# Altium footprint library MYLIB.PcbLib: 600 footprints (part 13 of 39)
Each footprint in its own frame and in the unit in brackets; x right, y up, seen from the top. Pads: shape width x height; smd on the part's side, far side on the other; paste and mask are expansions set on the pad; w line width, h text height; cw(c..) or ccw(c..) is an arc to the next point about the centre after c.
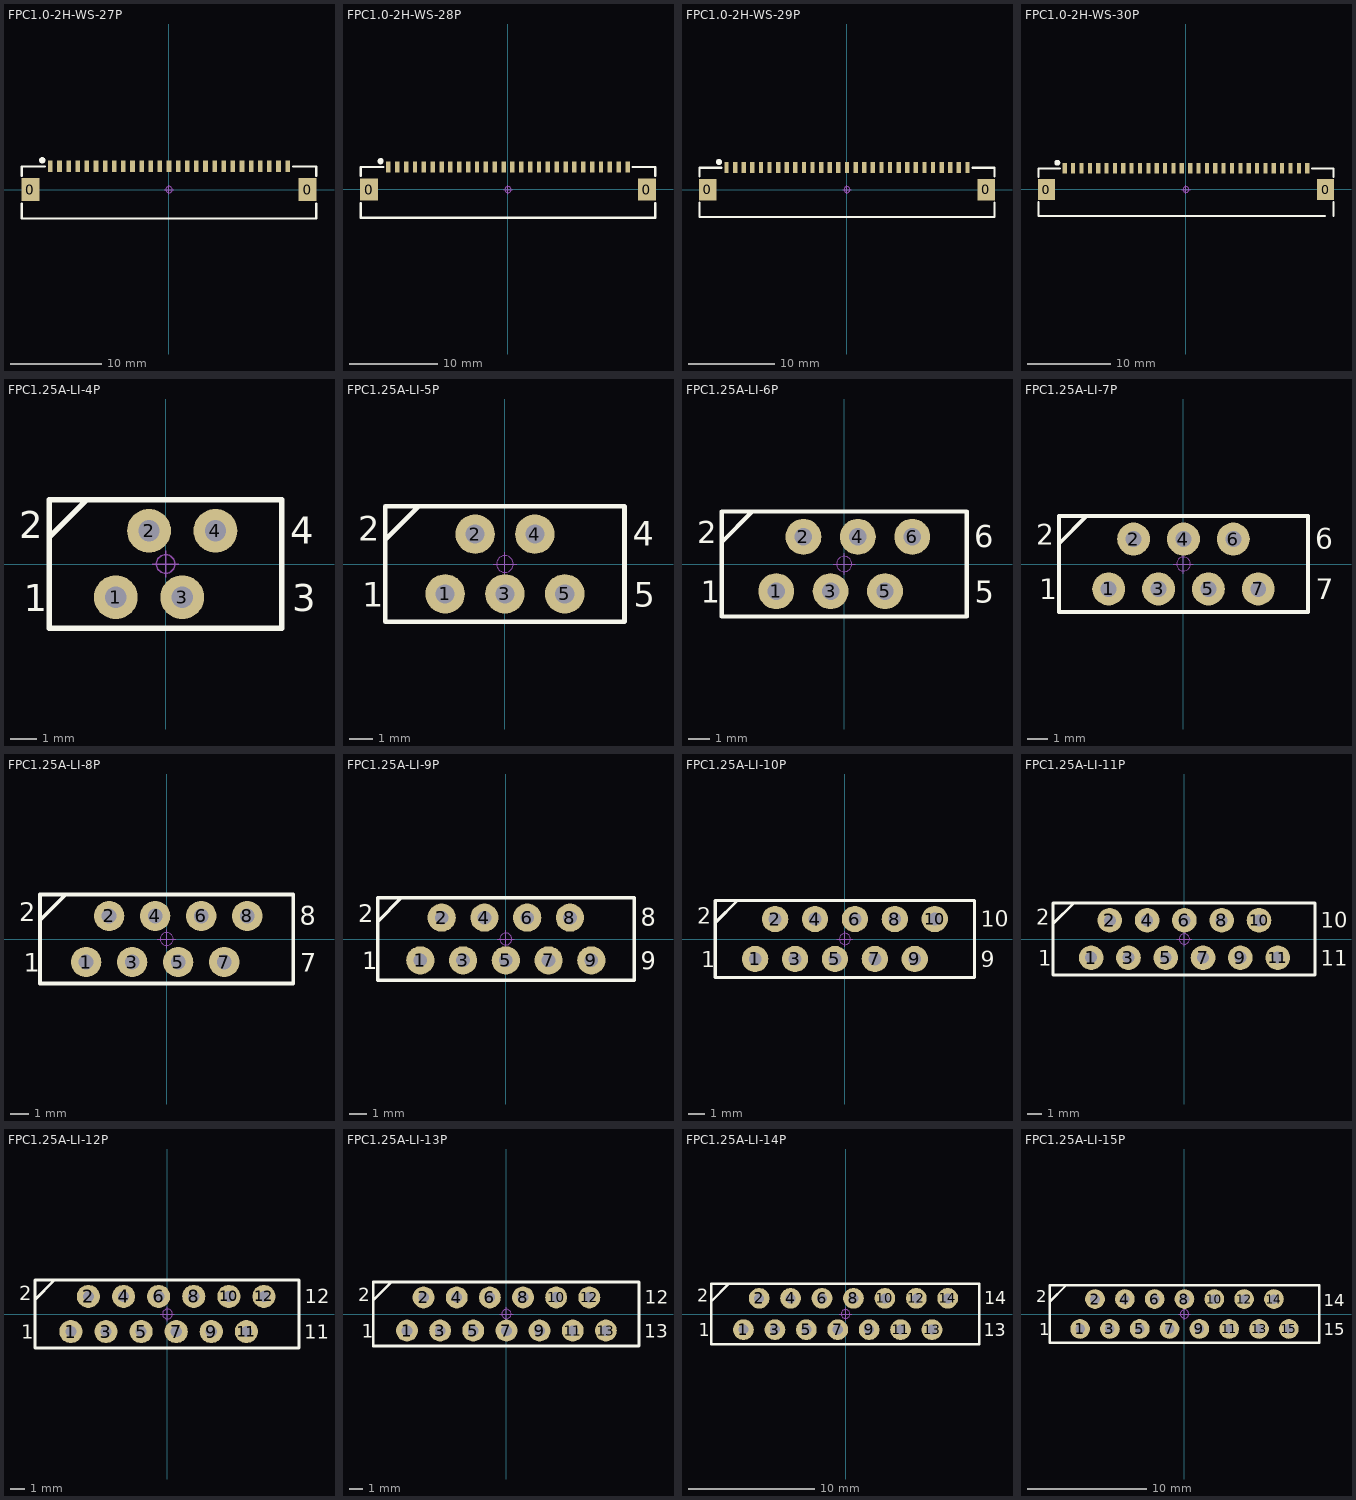
[diagram p12: the footprints below, top view; thin cyan lines are the x and y axes]

## FPC1.0-2H-WS-27P [mm] "翻盖FPC，脚距1mm，不含脚（长31.9mm，宽5.2mm，高1.96mm）"
pads (29):
  rect 2x2.5 smd: 0(-15.19,0) 0(15.19,0)
  rect 0.5x1.25 smd: 1(-13,2.575) 2(-12,2.575) 3(-11,2.575) 4(-10,2.575) 5(-9,2.575) 6(-8,2.575) 7(-7,2.575) 8(-6,2.575) 9(-5,2.575) 10(-4,2.575) 11(-3,2.575) 12(-2,2.575) 13(-1,2.575) 14(0,2.575) 15(1,2.575) 16(2,2.575) 17(3,2.575) 18(4,2.575) 19(5,2.575) 20(6,2.575) 21(7,2.575) 22(8,2.575) 23(9,2.575) 24(10,2.575) 25(11,2.575) 26(12,2.575) 27(13,2.575)
Top Overlay:
  circle w0.5: c-13.889,3.21 r0.1
  lines w0.254: -16.136,-1.524 -16.136,-3.175 16.134,-3.175 16.134,-1.524 ; -16.136,1.524 -16.136,2.54 -13.596,2.54 ; 13.594,2.54 16.134,2.54 16.134,1.524
Mechanical 15:
  circle w0.05: c0,0 r0.35
  lines w0.05: -0.5,0 0.5,0 ; 0,-0.5 0,0.5
3D body "FPC1.0 2H-WS-27P.STEP": height 2, standoff -0.02, extent -15.95,-3.15 15.95,2.85

## FPC1.0-2H-WS-28P [mm] "翻盖FPC，脚距1mm，不含脚（长32.9mm，宽5.2mm，高1.96mm）"
pads (30):
  rect 2x2.5 smd: 0(-15.69,-0.04) 0(15.69,-0.04)
  rect 0.5x1.25 smd: 1(-13.5,2.535) 2(-12.5,2.535) 3(-11.5,2.535) 4(-10.5,2.535) 5(-9.5,2.535) 6(-8.5,2.535) 7(-7.5,2.535) 8(-6.5,2.535) 9(-5.5,2.535) 10(-4.5,2.535) 11(-3.5,2.535) 12(-2.5,2.535) 13(-1.5,2.535) 14(-0.5,2.535) 15(0.5,2.535) 16(1.5,2.535) 17(2.5,2.535) 18(3.5,2.535) 19(4.5,2.535) 20(5.5,2.535) 21(6.5,2.535) 22(7.5,2.535) 23(8.5,2.535) 24(9.5,2.535) 25(10.5,2.535) 26(11.5,2.535) 27(12.5,2.535) 28(13.5,2.535)
Top Overlay:
  circle w0.5: c-14.389,3.17 r0.1
  lines w0.254: -16.636,-1.564 -16.636,-3.215 16.634,-3.215 16.634,-1.564 ; -16.636,1.484 -16.636,2.5 -14.096,2.5 ; 14.094,2.5 16.634,2.5 16.634,1.484
Mechanical 15:
  circle w0.05: c0,-0.04 r0.35
  lines w0.05: -0.5,-0.04 0.5,-0.04 ; 0,-0.54 0,0.46
3D body "FPC1.0 2H-WS-28P.STEP": height 2, standoff -0.02, extent -16.45,-3.19 16.45,2.81

## FPC1.0-2H-WS-29P [mm] "翻盖FPC，脚距1mm，不含脚（长33.9mm，宽5.2mm，高1.96mm）"
pads (31):
  rect 2x2.5 smd: 0(-16.19,0) 0(16.19,0)
  rect 0.5x1.25 smd: 1(-14,2.575) 2(-13,2.575) 3(-12,2.575) 4(-11,2.575) 5(-10,2.575) 6(-9,2.575) 7(-8,2.575) 8(-7,2.575) 9(-6,2.575) 10(-5,2.575) 11(-4,2.575) 12(-3,2.575) 13(-2,2.575) 14(-1,2.575) 15(0,2.575) 16(1,2.575) 17(2,2.575) 18(3,2.575) 19(4,2.575) 20(5,2.575) 21(6,2.575) 22(7,2.575) 23(8,2.575) 24(9,2.575) 25(10,2.575) 26(11,2.575) 27(12,2.575) 28(13,2.575) 29(14,2.575)
Top Overlay:
  circle w0.5: c-14.889,3.21 r0.1
  lines w0.254: -17.136,-1.524 -17.136,-3.175 17.134,-3.175 17.134,-1.524 ; -17.136,1.524 -17.136,2.54 -14.596,2.54 ; 14.594,2.54 17.134,2.54 17.134,1.524
Mechanical 15:
  circle w0.05: c0,0 r0.35
  lines w0.05: -0.5,0 0.5,0 ; 0,-0.5 0,0.5
3D body "FPC1.0 2H-WS-29P.STEP": height 2, standoff -0.02, extent -16.95,-3.15 16.95,2.85

## FPC1.0-2H-WS-30P [mm] "翻盖FPC，脚距1mm，不含脚（长34.9mm，宽5.2mm，高1.96mm）"
pads (32):
  rect 2x2.5 smd: 0(-16.69,-0.04) 0(16.69,-0.04)
  rect 0.5x1.25 smd: 1(-14.5,2.535) 2(-13.5,2.535) 3(-12.5,2.535) 4(-11.5,2.535) 5(-10.5,2.535) 6(-9.5,2.535) 7(-8.5,2.535) 8(-7.5,2.535) 9(-6.5,2.535) 10(-5.5,2.535) 11(-4.5,2.535) 12(-3.5,2.535) 13(-2.5,2.535) 14(-1.5,2.535) 15(-0.5,2.535) 16(0.5,2.535) 17(1.5,2.535) 18(2.5,2.535) 19(3.5,2.535) 20(4.5,2.535) 21(5.5,2.535) 22(6.5,2.535) 23(7.5,2.535) 24(8.5,2.535) 25(9.5,2.535) 26(10.5,2.535) 27(11.5,2.535) 28(12.5,2.535) 29(13.5,2.535) 30(14.5,2.535)
Top Overlay:
  circle w0.5: c-15.389,3.17 r0.1
  lines w0.254: -17.636,-1.564 -17.636,-3.215 16.634,-3.215 ; -17.636,1.484 -17.636,2.5 -15.096,2.5 ; 15.094,2.5 17.634,2.5 17.634,1.484 ; 17.634,-3.215 17.634,-1.564
Mechanical 15:
  circle w0.05: c0,-0.04 r0.35
  lines w0.05: -0.5,-0.04 0.5,-0.04 ; 0,-0.54 0,0.46
3D body "FPC1.0 2H-WS-30P.STEP": height 2, standoff -0.02, extent -17.45,-3.19 17.45,2.81

## FPC1.25A-LI-4P [mm] "4脚，长：8.5mm，宽：4.5mm，高：7.3mm"
pads (4):
  round 1.65 hole 0.8: 1(-1.875,-1.25) 2(-0.625,1.25) 3(0.625,-1.25) 4(1.875,1.25)
Top Overlay:
  lines w0.2: -4.375,1.016 -2.978,2.413 ; -4.375,-2.413 4.375,-2.413 4.375,2.413 -4.375,2.413 -4.375,-2.413
  text "1" at -5.334,-1.778 h1.02
  text "2" at -5.518,0.965 h1.02
  text "4" at 4.699,0.762 h1.02
  text "3" at 4.756,-1.778 h1.02
Mechanical 15:
  circle w0.05: c0,0 r0.35
  lines w0.05: -0.5,0 0.5,0 ; 0,-0.5 0,0.5
3D body "FPC1.25-DIP-4P.STEP": height 7.3, standoff -2.55, extent -4.3,-2.25 4.3,2.25

## FPC1.25A-LI-5P [mm] "5脚，长：9.75mm，宽：4.5mm，高：7.3mm"
pads (5):
  round 1.65 hole 0.8: 1(-2.5,-1.25) 2(-1.25,1.25) 3(0,-1.25) 4(1.25,1.25) 5(2.5,-1.25)
Top Overlay:
  lines w0.2: -5,1.016 -3.603,2.413 ; -5,-2.413 -5,2.413 5,2.413 5,-2.413 -5,-2.413
  text "5" at 5.381,-1.778 h1.02
  text "4" at 5.334,0.762 h1.02
  text "2" at -6.143,0.965 h1.02
  text "1" at -5.969,-1.778 h1.02
Mechanical 15:
  circle w0.05: c0,0 r0.35
  lines w0.05: -0.5,0 0.5,0 ; 0,-0.5 0,0.5
3D body "FPC1.25-DIP-5P.STEP": height 7.3, standoff -2.55, extent -4.925,-2.25 4.925,2.25

## FPC1.25A-LI-6P [mm] "6脚，长：11mm，宽：4.5mm，高：7.3mm"
pads (6):
  round 1.65 hole 0.8: 1(-3.125,-1.25) 2(-1.875,1.25) 3(-0.625,-1.25) 4(0.625,1.25) 5(1.875,-1.25) 6(3.125,1.25)
Top Overlay:
  lines w0.2: -5.625,1.016 -4.228,2.413 ; 5.087,2.413 5.625,2.413 ; 5.625,2.413 -5.625,2.413 -5.625,-2.413 5.625,-2.413 5.625,2.413
  text "1" at -6.604,-1.778 h1.02
  text "2" at -6.768,0.965 h1.02
  text "6" at 5.969,0.762 h1.02
  text "5" at 6.006,-1.778 h1.02
Mechanical 15:
  circle w0.05: c0,0 r0.35
  lines w0.05: -0.5,0 0.5,0 ; 0,-0.5 0,0.5
3D body "FPC1.25-DIP-6P.STEP": height 7.3, standoff -2.55, extent -5.55,-2.25 5.55,2.25

## FPC1.25A-LI-7P [mm] "7脚，长：12.25mm，宽：4.5mm，高：7.3mm"
pads (7):
  round 1.65 hole 0.8: 1(-3.75,-1.25) 2(-2.5,1.25) 3(-1.25,-1.25) 4(0,1.25) 5(1.25,-1.25) 6(2.5,1.25) 7(3.75,-1.25)
Top Overlay:
  lines w0.2: -6.25,1.016 -4.853,2.413 ; -6.25,-2.413 -6.25,2.413 5.712,2.413 6.25,2.413 6.25,-2.413 -6.25,-2.413
  text "7" at 6.631,-1.778 h1.02
  text "6" at 6.604,0.762 h1.02
  text "2" at -7.393,0.965 h1.02
  text "1" at -7.239,-1.778 h1.02
Mechanical 15:
  circle w0.05: c0,0 r0.35
  lines w0.05: -0.5,0 0.5,0 ; 0,-0.5 0,0.5
3D body "FPC1.25-DIP-7P.STEP": height 7.3, standoff -2.55, extent -6.175,-2.25 6.175,2.25

## FPC1.25A-LI-8P [mm] "8脚，长：13.5mm，宽：4.5mm，高：7.3mm"
pads (8):
  round 1.65 hole 0.8: 1(-4.375,-1.25) 2(-3.125,1.25) 3(-1.875,-1.25) 4(-0.625,1.25) 5(0.625,-1.25) 6(1.875,1.25) 7(3.125,-1.25) 8(4.375,1.25)
Top Overlay:
  lines w0.2: -6.875,1.016 -5.478,2.413 ; -6.875,-2.413 -6.875,2.413 6.875,2.413 6.875,-2.413 -6.875,-2.413
  text "7" at 7.256,-1.778 h1.02
  text "8" at 7.239,0.762 h1.02
  text "2" at -8.018,0.965 h1.02
  text "1" at -7.747,-1.778 h1.02
Mechanical 15:
  circle w0.05: c0,0 r0.35
  lines w0.05: -0.5,0 0.5,0 ; 0,-0.5 0,0.5
3D body "FPC1.25-DIP-8P.STEP": height 7.3, standoff -2.55, extent -6.8,-2.25 6.8,2.25

## FPC1.25A-LI-9P [mm] "9脚，长：14.75mm，宽：4.5mm，高：7.3mm"
pads (9):
  round 1.65 hole 0.8: 1(-5,-1.25) 2(-3.75,1.25) 3(-2.5,-1.25) 4(-1.25,1.25) 5(0,-1.25) 6(1.25,1.25) 7(2.5,-1.25) 8(3.75,1.25) 9(5,-1.25)
Top Overlay:
  lines w0.2: -7.5,1.016 -6.103,2.413 ; -7.5,-2.413 7.5,-2.413 7.5,2.413 -7.5,2.413 -7.5,-2.413
  text "1" at -8.382,-1.778 h1.02
  text "2" at -8.643,0.965 h1.02
  text "8" at 7.874,0.762 h1.02
  text "9" at 7.881,-1.778 h1.02
Mechanical 15:
  circle w0.05: c0,0 r0.35
  lines w0.05: -0.5,0 0.5,0 ; 0,-0.5 0,0.5
3D body "FPC1.25-DIP-9P.STEP": height 7.3, standoff -2.55, extent -7.425,-2.25 7.425,2.25

## FPC1.25A-LI-10P [mm] "10脚，长：16mm，宽：4.5mm，高：7.3mm"
pads (10):
  round 1.65 hole 0.8: 1(-5.625,-1.25) 2(-4.375,1.25) 3(-3.125,-1.25) 4(-1.875,1.25) 5(-0.625,-1.25) 6(0.625,1.25) 7(1.875,-1.25) 8(3.125,1.25) 9(4.375,-1.25) 10(5.625,1.25)
Top Overlay:
  lines w0.2: -8.125,1.016 -6.728,2.413 ; -8.125,-2.413 8.125,-2.413 8.125,2.413 -8.125,2.413 -8.125,-2.413
  text "1" at -9.017,-1.778 h1.02
  text "2" at -9.268,0.965 h1.02
  text "10" at 8.509,0.762 h1.02
  text "9" at 8.506,-1.778 h1.02
Mechanical 15:
  circle w0.05: c0,0 r0.35
  lines w0.05: -0.5,0 0.5,0 ; 0,-0.5 0,0.5
3D body "FPC1.25-DIP-10P.STEP": height 7.3, standoff -2.55, extent -8.05,-2.25 8.05,2.25

## FPC1.25A-LI-11P [mm] "11脚，长：17.25mm，宽：4.5mm，高：7.3mm"
pads (11):
  round 1.65 hole 0.8: 1(-6.25,-1.25) 2(-5,1.25) 3(-3.75,-1.25) 4(-2.5,1.25) 5(-1.25,-1.25) 6(0,1.25) 7(1.25,-1.25) 8(2.5,1.25) 9(3.75,-1.25) 10(5,1.25) 11(6.25,-1.25)
Top Overlay:
  lines w0.2: -8.803,1.016 -7.406,2.413 ; -8.803,-2.413 8.75,-2.413 8.75,2.413 -8.803,2.413 -8.803,-2.413
  text "1" at -9.779,-1.778 h1.02
  text "2" at -9.946,0.965 h1.02
  text "10" at 9.144,0.762 h1.02
  text "11" at 9.131,-1.778 h1.02
Mechanical 15:
  circle w0.05: c0,0 r0.35
  lines w0.05: -0.5,0 0.5,0 ; 0,-0.5 0,0.5
3D body "FPC1.25-DIP-11P.STEP": height 7.3, standoff -2.55, extent -8.675,-2.25 8.675,2.25

## FPC1.25A-LI-12P [mm] "12脚，长：18.5mm，宽：4.5mm，高：7.3mm"
pads (12):
  round 1.65 hole 0.8: 1(-6.875,-1.25) 2(-5.625,1.25) 3(-4.375,-1.25) 4(-3.125,1.25) 5(-1.875,-1.25) 6(-0.625,1.25) 7(0.625,-1.25) 8(1.875,1.25) 9(3.125,-1.25) 10(4.375,1.25) 11(5.625,-1.25) 12(6.875,1.25)
Top Overlay:
  lines w0.2: -9.428,1.016 -8.031,2.413 ; -9.428,-2.413 -9.428,2.413 9.375,2.413 9.375,-2.413 -9.428,-2.413
  text "11" at 9.756,-1.778 h1.02
  text "12" at 9.779,0.762 h1.02
  text "2" at -10.571,0.965 h1.02
  text "1" at -10.414,-1.778 h1.02
Mechanical 15:
  circle w0.05: c0,0 r0.35
  lines w0.05: -0.5,0 0.5,0 ; 0,-0.5 0,0.5
3D body "FPC1.25-DIP-12P.STEP": height 7.3, standoff -2.55, extent -9.3,-2.25 9.3,2.25

## FPC1.25A-LI-13P [mm] "13脚，长：19.75mm，宽：4.5mm，高：7.3mm"
pads (13):
  round 1.65 hole 0.8: 1(-7.5,-1.25) 2(-6.25,1.25) 3(-5,-1.25) 4(-3.75,1.25) 5(-2.5,-1.25) 6(-1.25,1.25) 7(0,-1.25) 8(1.25,1.25) 9(2.5,-1.25) 10(3.75,1.25) 11(5,-1.25) 12(6.25,1.25) 13(7.5,-1.25)
Top Overlay:
  lines w0.2: -10.053,1.016 -8.656,2.413 ; -10.053,-2.413 10,-2.413 10,2.413 -10.053,2.413 -10.053,-2.413
  text "1" at -10.922,-1.778 h1.02
  text "2" at -11.196,0.965 h1.02
  text "12" at 10.414,0.762 h1.02
  text "13" at 10.381,-1.778 h1.02
Mechanical 15:
  circle w0.05: c0,0 r0.35
  lines w0.05: -0.5,0 0.5,0 ; 0,-0.5 0,0.5
3D body "FPC1.25-DIP-13P.STEP": height 7.3, standoff -2.55, extent -9.925,-2.25 9.925,2.25

## FPC1.25A-LI-14P [mm] "14脚，长：21mm，宽：4.5mm，高：7.3mm"
pads (14):
  round 1.65 hole 0.8: 1(-8.125,-1.25) 2(-6.875,1.25) 3(-5.625,-1.25) 4(-4.375,1.25) 5(-3.125,-1.25) 6(-1.875,1.25) 7(-0.625,-1.25) 8(0.625,1.25) 9(1.875,-1.25) 10(3.125,1.25) 11(4.375,-1.25) 12(5.625,1.25) 13(6.875,-1.25) 14(8.125,1.25)
Top Overlay:
  lines w0.2: -10.678,1.016 -9.281,2.413 ; -10.678,-2.413 10.625,-2.413 10.625,2.413 -10.678,2.413 -10.678,-2.413
  text "14" at 11.029,0.762 h1.02
  text "1" at -11.684,-1.778 h1.02
  text "2" at -11.821,0.965 h1.02
  text "13" at 11.006,-1.778 h1.02
Mechanical 15:
  circle w0.05: c0,0 r0.35
  lines w0.05: -0.5,0 0.5,0 ; 0,-0.5 0,0.5
3D body "FPC1.25-DIP-14P.STEP": height 7.3, standoff -2.55, extent -10.55,-2.25 10.55,2.25

## FPC1.25A-LI-15P [mm] "15脚，长：22.4mm，宽：4.5mm，高：7.3mm"
pads (15):
  round 1.65 hole 0.8: 1(-8.75,-1.25) 2(-7.5,1.25) 3(-6.25,-1.25) 4(-5,1.25) 5(-3.75,-1.25) 6(-2.5,1.25) 7(-1.25,-1.25) 8(0,1.25) 9(1.25,-1.25) 10(2.5,1.25) 11(3.75,-1.25) 12(5,1.25) 13(6.25,-1.25) 14(7.5,1.25) 15(8.75,-1.25)
Top Overlay:
  lines w0.2: -11.303,1.016 -9.906,2.413 ; -11.303,-2.413 -11.303,2.413 11.303,2.413 11.303,-2.413 -11.303,-2.413
  text "14" at 11.667,0.655 h1.02
  text "15" at 11.684,-1.778 h1.02
  text "2" at -12.446,0.965 h1.02
  text "1" at -12.192,-1.778 h1.02
Mechanical 15:
  circle w0.05: c0,0 r0.35
  lines w0.05: -0.5,0 0.5,0 ; 0,-0.5 0,0.5
3D body "FPC1.25-DIP-15P.STEP": height 7.3, standoff -2.55, extent -11.2,-2.25 11.2,2.25